# Altium footprint library PCB_Connector.PcbLib: 65 footprints (part 5 of 5)
Each footprint in its own frame and in the unit in brackets; x right, y up, seen from the top. Pads: shape width x height; smd on the part's side, far side on the other; paste and mask are expansions set on the pad; w line width, h text height; cw(c..) or ccw(c..) is an arc to the next point about the centre after c.
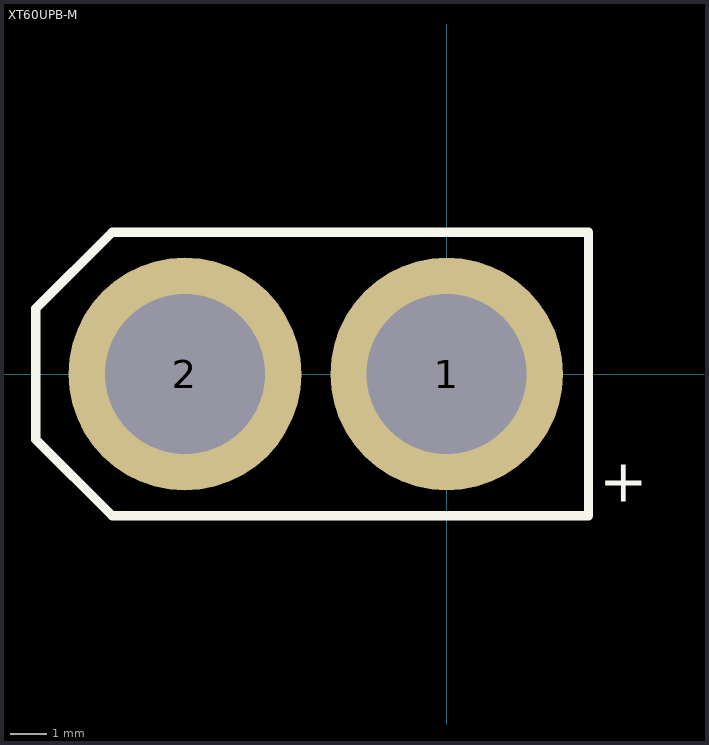
[diagram p4: the footprint, top view; thin cyan lines are the x and y axes]

## XT60UPB-M [mm]
pads (2):
  round 6.4 hole 4.4: 1(0,0) 2(-7.2,0)
Top Overlay:
  lines w0.254: -11.3,-1.8 -9.2,-3.9 3.9,-3.9 3.9,3.9 -9.2,3.9 -11.3,1.8 -11.3,-1.8
  text "+" at 4.2,-3.9 h2
3D body "XT60UPB-F.STEP": height 13.91, standoff -1.69, extent -11.398,-3.95 3.945,3.951